# Altium integrated library 兰格封装.IntLib: 1176 symbols (part 6 of 6)
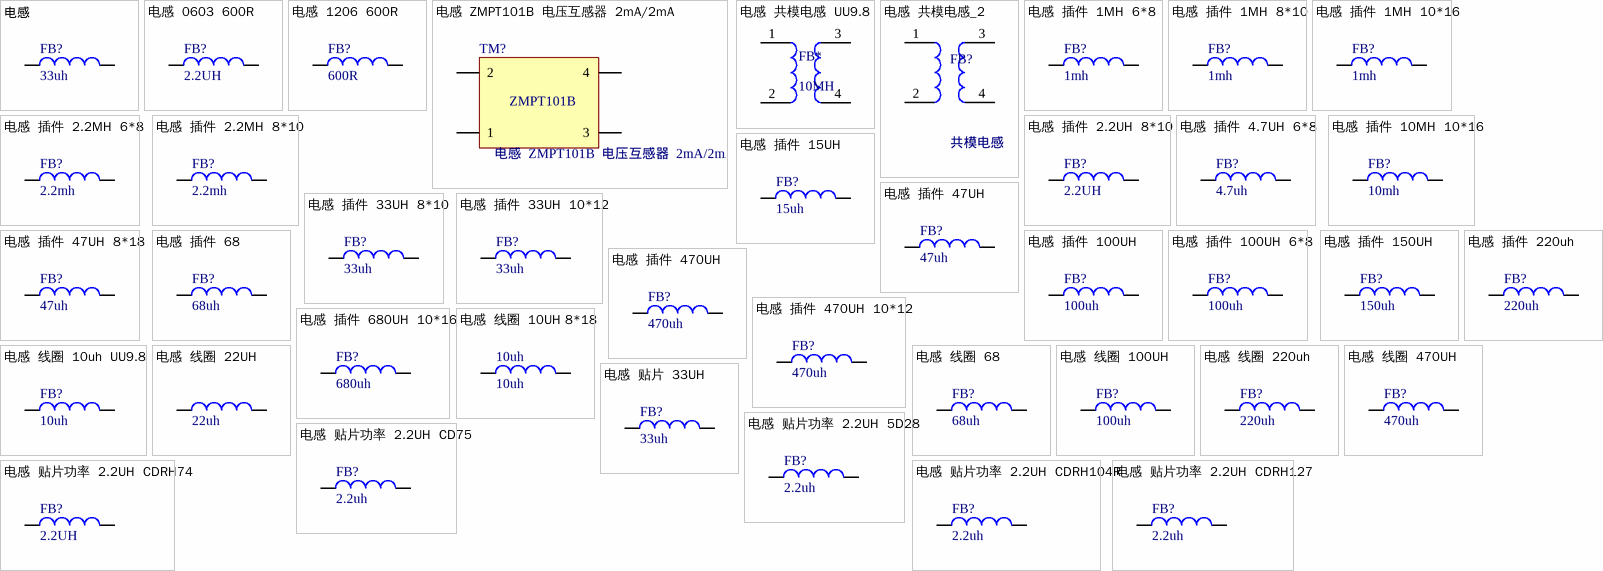
[diagram p53: symbols 电感 to 电感  贴片功率  2.2UH  CDRH127]

## 电感  贴片功率  2.2UH  CDRH127
designator FB?, comment 2.2uh
RH127-2.2UH 贴片功率电感; 加工方式: 贴片; 物料代码: 3.01.09.02.03.0015; 仓库名称: 元件仓; 助记码: RH127-2.2UH TPGLDG; 单位: ֻ; 规格型号: 带屏蔽; 物料名称: RH127-2.2UH 贴片功率电感
footprint CDRH127 (12*12*8mm（长宽高）)
pins: 1, 2

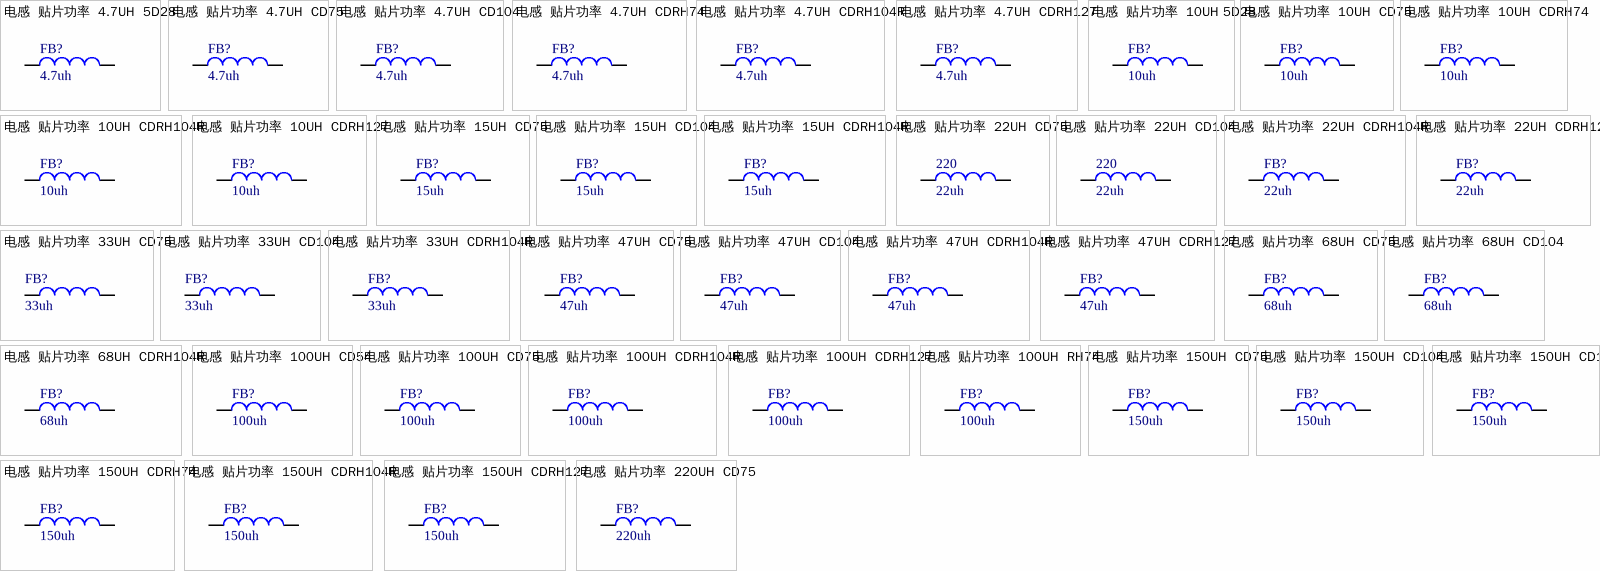
[diagram p47: symbols 电感  贴片功率  4.7UH  5D28 to 电感  贴片功率  220UH  CD75]

## 电感  贴片功率  4.7UH  5D28
designator FB?, comment 4.7uh
5D28-4.7UH 贴片功率电感; 加工方式: 贴片; 物料代码: 3.01.09.02.03.0010; 仓库名称: 元件仓; 助记码: 5D28-4.7UH TPGLDG; 单位: ֻ; 规格型号: 带屏蔽; 物料名称: 5D28-4.7UH 贴片功率电感
footprint CDRH 5D28
pins: 1, 2

## 电感  贴片功率  4.7UH  CD75
designator FB?, comment 4.7uh
CD75-4.7UH贴片功率电感（无）; 加工方式: 贴片; 仓库名称: 元件仓; 单位: ֻ; 物料名称: *; 物料代码: *; 备注: *; 助记码: *; 规格型号: *
footprint CD 75
pins: 1, 2

## 电感  贴片功率  4.7UH  CD104
designator FB?, comment 4.7uh
CD104-4.7UH贴片功率电感（无）; 加工方式: 贴片; 仓库名称: 元件仓; 单位: ֻ; 物料名称: *; 物料代码: *; 备注: *; 助记码: *; 规格型号: *
footprint CD104 (10*9*4mm（长宽高）)
pins: 1, 2

## 电感  贴片功率  4.7UH  CDRH74
designator FB?, comment 4.7uh
RH74-4.7UH 贴片功率电感; 加工方式: 贴片; 物料代码: 3.01.09.02.03.0002; 仓库名称: 元件仓; 助记码: RH74-4.7UH TPGLDG; 单位: ֻ; 规格型号: 带屏蔽; 物料名称: RH74-4.7UH 贴片功率电感
footprint CDRH74 (7.3*7.3*4.5mm（长宽高）)
pins: 1, 2

## 电感  贴片功率  4.7UH  CDRH104R
designator FB?, comment 4.7uh
RH104-4.7UH 贴片功率电感; 加工方式: 贴片; 物料代码: 3.01.09.02.03.0013; 仓库名称: 元件仓; 助记码: RH104-4.7UH TPGLDG; 单位: ֻ; 规格型号: 带屏蔽; 物料名称: RH104-4.7UH 贴片功率电感
footprint CDRH 104R
pins: 1, 2

## 电感  贴片功率  4.7UH  CDRH127
designator FB?, comment 4.7uh
RH127-4.7UH 贴片功率电感; 加工方式: 贴片; 仓库名称: 元件仓; 单位: ֻ; 规格型号: 带屏蔽; 物料名称: RH127-4.7UH 贴片功率电感
footprint CDRH127 (12*12*8mm（长宽高）)
pins: 1, 2

## 电感  贴片功率  10UH 5D28
designator FB?, comment 10uh
5D28-10UH 贴片功率电感; 加工方式: 贴片; 物料代码: 3.01.09.02.03.0011; 仓库名称: 元件仓; 助记码: 5D28-10UH TPGLDG; 单位: ֻ; 规格型号: 带屏蔽; 物料名称: 5D28-10UH 贴片功率电感
footprint CDRH 5D28
pins: 1, 2

## 电感  贴片功率  10UH  CD75
designator FB?, comment 10uh
CD75-10UH 贴片功率电感 （无）; 物料名称: *; 物料代码: *; 备注: *; 助记码: *; 单位: *; 规格型号: *
footprint CD 75
pins: 1, 2

## 电感  贴片功率  10UH  CDRH74
designator FB?, comment 10uh
RH74-10UH 贴片功率电感; 加工方式: 贴片; 物料代码: 3.01.09.02.03.0003; 仓库名称: 元件仓; 助记码: RH74-10UH TPGLDG; 单位: ֻ; 规格型号: 带屏蔽; 物料名称: RH74-10UH 贴片功率电感
footprint CDRH74 (7.3*7.3*4.5mm（长宽高）)
pins: 1, 2

## 电感  贴片功率  10UH  CDRH104R
designator FB?, comment 10uh
RH104-10UH 贴片功率电感; 加工方式: 贴片; 物料代码: 3.01.09.02.03.0014; 仓库名称: 元件仓; 助记码: RH104-10UH TPGLDG; 单位: ֻ; 规格型号: 带屏蔽; 物料名称: RH104-10UH 贴片功率电感
footprint CDRH 104R
pins: 1, 2

## 电感  贴片功率  10UH  CDRH127
designator FB?, comment 10uh
RH127-10UH 贴片功率电感; 加工方式: 贴片; 物料代码: 3.01.09.02.03.0017; 仓库名称: 元件仓; 助记码: RH127-10UH TPGLDG; 单位: ֻ; 规格型号: 带屏蔽; 物料名称: RH127-10UH 贴片功率电感
footprint CDRH127 (12*12*8mm（长宽高）)
pins: 1, 2

## 电感  贴片功率  15UH  CD75
designator FB?, comment 15uh
CD75-15UH 贴片功率电感 （无）; 物料名称: *; 物料代码: *; 备注: *; 助记码: *; 单位: *; 规格型号: *
footprint CD 75
pins: 1, 2

## 电感  贴片功率  15UH  CD104
designator FB?, comment 15uh
CD104-15UH 贴片功率电感 （无）; 加工方式: 贴片; 仓库名称: 元件仓; 单位: ֻ; 物料名称: *; 物料代码: *; 备注: *; 助记码: *; 规格型号: *
footprint CD104 (10*9*4mm（长宽高）)
pins: 1, 2

## 电感  贴片功率  15UH  CDRH104R
designator FB?, comment 15uh
RH104-15UH 贴片功率电感; 加工方式: 贴片; 仓库名称: 元件仓; 单位: ֻ; 规格型号: 带屏蔽
footprint CDRH 104R
pins: 1, 2

## 电感  贴片功率  22UH  CD75
designator 220, comment 22uh
CD75-22UH贴片功率电感（无）; 物料名称: *; 物料代码: *; 备注: *; 助记码: *; 单位: *; 规格型号: *
footprint CD 75
pins: 1, 2

## 电感  贴片功率  22UH  CD104
designator 220, comment 22uh
CD104-22UH贴片功率电感（无）; 加工方式: 贴片; 仓库名称: 元件仓; 单位: ֻ; 物料名称: *; 物料代码: *; 备注: *; 助记码: *; 规格型号: *
footprint CD104 (10*9*4mm（长宽高）)
pins: 1, 2

## 电感  贴片功率  22UH  CDRH104R
designator FB?, comment 22uh
RH104-22UH 贴片功率电感; 加工方式: 贴片; 仓库名称: 元件仓; 单位: ֻ; 规格型号: 带屏蔽
footprint CDRH 104R
pins: 1, 2

## 电感  贴片功率  22UH  CDRH127
designator FB?, comment 22uh
RH127-22UH 贴片功率电感; 加工方式: 贴片; 物料代码: 3.01.09.02.03.0004; 仓库名称: 元件仓; 助记码: RH127-22UH TPGLDG; 单位: ֻ; 规格型号: 带屏蔽; 物料名称: RH127-22UH 贴片功率电感
footprint CDRH127 (12*12*8mm（长宽高）)
pins: 1, 2

## 电感  贴片功率  33UH  CD75
designator FB?, comment 33uh
CD75-33UH 贴片功率电感 （无）; 物料名称: *; 物料代码: *; 备注: *; 助记码: *; 单位: *; 规格型号: *
footprint CD 75
pins: 1, 2

## 电感  贴片功率  33UH  CD104
designator FB?, comment 33uh
CD104-33UH 贴片功率电感 （无）; 加工方式: 贴片; 仓库名称: 元件仓; 单位: ֻ; 物料名称: *; 物料代码: *; 备注: *; 助记码: *; 规格型号: *
footprint CD104 (10*9*4mm（长宽高）)
pins: 1, 2

## 电感  贴片功率  33UH  CDRH104R
designator FB?, comment 33uh
RH104-33UH 贴片功率电感; 加工方式: 贴片; 仓库名称: 元件仓; 单位: ֻ; 规格型号: 带屏蔽
footprint CDRH 104R
pins: 1, 2

## 电感  贴片功率  47UH  CD75
designator FB?, comment 47uh
CD75-47UH 贴片功率电感  （无）; 物料名称: *; 物料代码: *; 备注: *; 助记码: *; 单位: *; 规格型号: *
footprint CD 75
pins: 1, 2

## 电感  贴片功率  47UH  CD104
designator FB?, comment 47uh
CD104-47UH 贴片功率电感  （无）; 加工方式: 贴片; 仓库名称: 元件仓; 单位: ֻ; 物料名称: *; 物料代码: *; 备注: *; 助记码: *; 规格型号: *
footprint CD104 (10*9*4mm（长宽高）)
pins: 1, 2

## 电感  贴片功率  47UH  CDRH104R
designator FB?, comment 47uh
RH104-47UH 贴片功率电感; 加工方式: 贴片; 仓库名称: 元件仓; 单位: ֻ; 规格型号: 带屏蔽
footprint CDRH 104R
pins: 1, 2

## 电感  贴片功率  47UH  CDRH127
designator FB?, comment 47uh
RH127-47UH 贴片功率电感; 加工方式: 贴片; 物料代码: 3.01.09.02.03.0005; 仓库名称: 元件仓; 助记码: RH127-47UH TPGLDG; 单位: ֻ; 规格型号: 带屏蔽; 物料名称: RH127-47UH 贴片功率电感
footprint CDRH127 (12*12*8mm（长宽高）)
pins: 1, 2

## 电感  贴片功率  68UH  CD75
designator FB?, comment 68uh
CD75-68UH 贴片功率电感  （无）; 加工方式: 贴片; 仓库名称: 元件仓; 单位: ֻ; 物料名称: *; 物料代码: *; 备注: *; 助记码: *; 规格型号: *
footprint CD 75
pins: 1, 2

## 电感  贴片功率  68UH  CD104
designator FB?, comment 68uh
CD104-68UH 贴片功率电感  （无）; 加工方式: 贴片; 仓库名称: 元件仓; 单位: ֻ; 物料名称: *; 物料代码: *; 备注: *; 助记码: *; 规格型号: *
footprint CD104 (10*9*4mm（长宽高）)
pins: 1, 2

## 电感  贴片功率  68UH  CDRH104R
designator FB?, comment 68uh
RH104-68UH 贴片功率电感; 加工方式: 贴片; 仓库名称: 元件仓; 单位: ֻ; 规格型号: 带屏蔽
footprint CDRH 104R
pins: 1, 2

## 电感  贴片功率  100UH  CD54
designator FB?, comment 100uh
CD54-100UH贴片功率电感（无）; 物料名称: *; 物料代码: *; 备注: *; 助记码: *; 单位: *; 规格型号: *
footprint CD 54
pins: 1, 2

## 电感  贴片功率  100UH  CD75
designator FB?, comment 100uh
CD75-100UH 贴片功率电感; 加工方式: 贴片; 仓库名称: 元件仓; 单位: ֻ; 规格型号: 无屏蔽
footprint CD 75
pins: 1, 2

## 电感  贴片功率  100UH  CDRH104R
designator FB?, comment 100uh
RH104-100UH 贴片功率电感; 加工方式: 贴片; 仓库名称: 元件仓; 单位: ֻ; 规格型号: 带屏蔽
footprint CDRH 104R
pins: 1, 2

## 电感  贴片功率  100UH  CDRH127
designator FB?, comment 100uh
RH127-100UH 贴片功率电感; 加工方式: 贴片; 物料代码: 3.01.09.02.03.0006; 仓库名称: 元件仓; 助记码: RH127-100UH TPGLDG; 单位: ֻ; 规格型号: 带屏蔽; 物料名称: RH127-100UH 贴片功率电感
footprint CDRH127 (12*12*8mm（长宽高）)
pins: 1, 2

## 电感  贴片功率  100UH  RH74
designator FB?, comment 100uh
RH74-100UH 贴片功率电感  （无）; 物料名称: *; 物料代码: *; 备注: *; 助记码: *; 单位: *; 规格型号: *
footprint CDRH74 (7.3*7.3*4.5mm（长宽高）)
pins: 1, 2

## 电感  贴片功率  150UH  CD75
designator FB?, comment 150uh
CD75-150UH 贴片功率电感; 加工方式: 贴片; 物料代码: 3.01.09.02.03.0007; 仓库名称: 元件仓; 助记码: CD75-150UH TPGLDG; 单位: ֻ; 规格型号: 无屏蔽; 物料名称: CD75-150UH 贴片功率电感
footprint CD 75
pins: 1, 2

## 电感  贴片功率  150UH  CD104
designator FB?, comment 150uh
CD104-150UH 贴片功率电感; 加工方式: 贴片; 仓库名称: 元件仓; 单位: ֻ; 规格型号: 无屏蔽; 物料名称: CD104-150UH 贴片功率电感
footprint CD104 (10*9*4mm（长宽高）)
pins: 1, 2

## 电感  贴片功率  150UH  CD127
designator FB?, comment 150uh
CD127-150UH 贴片功率电感（无）; 加工方式: 贴片; 仓库名称: 元件仓; 单位: ֻ; 规格型号: 无屏蔽
footprint CD 127
pins: 1, 2

## 电感  贴片功率  150UH  CDRH74
designator FB?, comment 150uh
RH74-150UH 贴片功率电感  （无）; 物料名称: *; 物料代码: *; 备注: *; 助记码: *; 单位: *; 规格型号: *
footprint CDRH74 (7.3*7.3*4.5mm（长宽高）)
pins: 1, 2

## 电感  贴片功率  150UH  CDRH104R
designator FB?, comment 150uh
RH104-150UH 贴片功率电感; 加工方式: 贴片; 仓库名称: 元件仓; 单位: ֻ; 规格型号: 带屏蔽
footprint CDRH 104R
pins: 1, 2

## 电感  贴片功率  150UH  CDRH127
designator FB?, comment 150uh
RH127-150UH 贴片功率电感  （无）; 物料名称: *; 物料代码: *; 备注: *; 助记码: *; 单位: *; 规格型号: *
footprint CDRH127 (12*12*8mm（长宽高）)
pins: 1, 2

## 电感  贴片功率  220UH  CD75
designator FB?, comment 220uh
CD75-220UH 贴片功率电感; 加工方式: 贴片; 物料代码: 3.01.09.02.03.0008; 仓库名称: 元件仓; 助记码: CD75-220UH TPGLDG; 单位: ֻ; 规格型号: 无屏蔽; 物料名称: CD75-220UH 贴片功率电感
footprint CD 75
pins: 1, 2

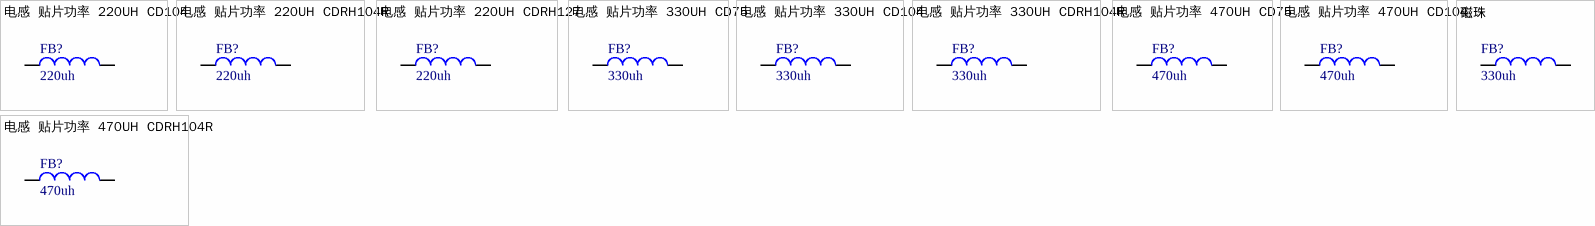
[diagram p48: symbols 电感  贴片功率  220UH  CD104 to 磁珠]

## 电感  贴片功率  220UH  CD104
designator FB?, comment 220uh
CD104-220UH 贴片功率电感; 加工方式: 贴片; 仓库名称: 元件仓; 单位: ֻ; 规格型号: 无屏蔽; 物料名称: CD104-220UH 贴片功率电感
footprint CD104 (10*9*4mm（长宽高）)
pins: 1, 2

## 电感  贴片功率  220UH  CDRH104R
designator FB?, comment 220uh
RH104-220UH 贴片功率电感; 加工方式: 贴片; 仓库名称: 元件仓; 单位: ֻ; 规格型号: 带屏蔽; 物料名称: RH104-220UH 贴片功率电感
footprint CDRH 104R
pins: 1, 2

## 电感  贴片功率  220UH  CDRH127
designator FB?, comment 220uh
RH127-220UH 贴片功率电感  （无）; 加工方式: 贴片; 仓库名称: 元件仓; 单位: ֻ; 物料名称: *; 物料代码: *; 备注: *; 助记码: *; 规格型号: *
footprint CDRH127 (12*12*8mm（长宽高）)
pins: 1, 2

## 电感  贴片功率  330UH  CD75
designator FB?, comment 330uh
CD75-330UH 贴片功率电感  （无）; 加工方式: 贴片; 仓库名称: 元件仓; 规格型号: 无屏蔽; 物料名称: *; 物料代码: *; 备注: *; 助记码: *; 单位: *
footprint CD 75
pins: 1, 2

## 电感  贴片功率  330UH  CD104
designator FB?, comment 330uh
CD104-330UH 贴片功率电感  （无）; 加工方式: 贴片; 仓库名称: 元件仓; 单位: ֻ; 物料名称: *; 物料代码: *; 备注: *; 助记码: *; 规格型号: *
footprint CD104 (10*9*4mm（长宽高）)
pins: 1, 2

## 电感  贴片功率  330UH  CDRH104R
designator FB?, comment 330uh
RH104-330UH 贴片功率电感; 加工方式: 贴片; 仓库名称: 元件仓; 单位: ֻ; 规格型号: 带屏蔽
footprint CDRH 104R
pins: 1, 2

## 电感  贴片功率  470UH  CD75
designator FB?, comment 470uh
CD75-470UH 贴片功率电感  （无）; 加工方式: 贴片; 仓库名称: 元件仓; 物料名称: *; 物料代码: *; 备注: *; 助记码: *; 单位: *; 规格型号: *
footprint CD 75
pins: 1, 2

## 电感  贴片功率  470UH  CD104
designator FB?, comment 470uh
CD104-470UH 贴片功率电感  （无）; 加工方式: 贴片; 仓库名称: 元件仓; 单位: ֻ; 物料名称: *; 物料代码: *; 备注: *; 助记码: *; 规格型号: *
footprint CD104 (10*9*4mm（长宽高）)
pins: 1, 2

## 电感  贴片功率  470UH  CDRH104R
designator FB?, comment 470uh
RH104-470UH 贴片功率电感; 加工方式: 贴片; 仓库名称: 元件仓; 单位: ֻ; 规格型号: 带屏蔽
footprint CDRH 104R
pins: 1, 2

## 磁珠
designator FB?, comment 330uh
磁珠; 加工方式: 贴片; 物料名称: *; 物料代码: *; 规格型号: *; 助记码: *; 单位: *; 仓库名称: *; 备注: *
footprint CD 75
pins: 1, 2